# Altium footprint library Semicon-Discrete.pcblib: 205 footprints (part 1 of 13)
Each footprint in its own frame and in the unit in brackets; x right, y up, seen from the top. Pads: shape width x height; smd on the part's side, far side on the other; paste and mask are expansions set on the pad; w line width, h text height; cw(c..) or ccw(c..) is an arc to the next point about the centre after c.
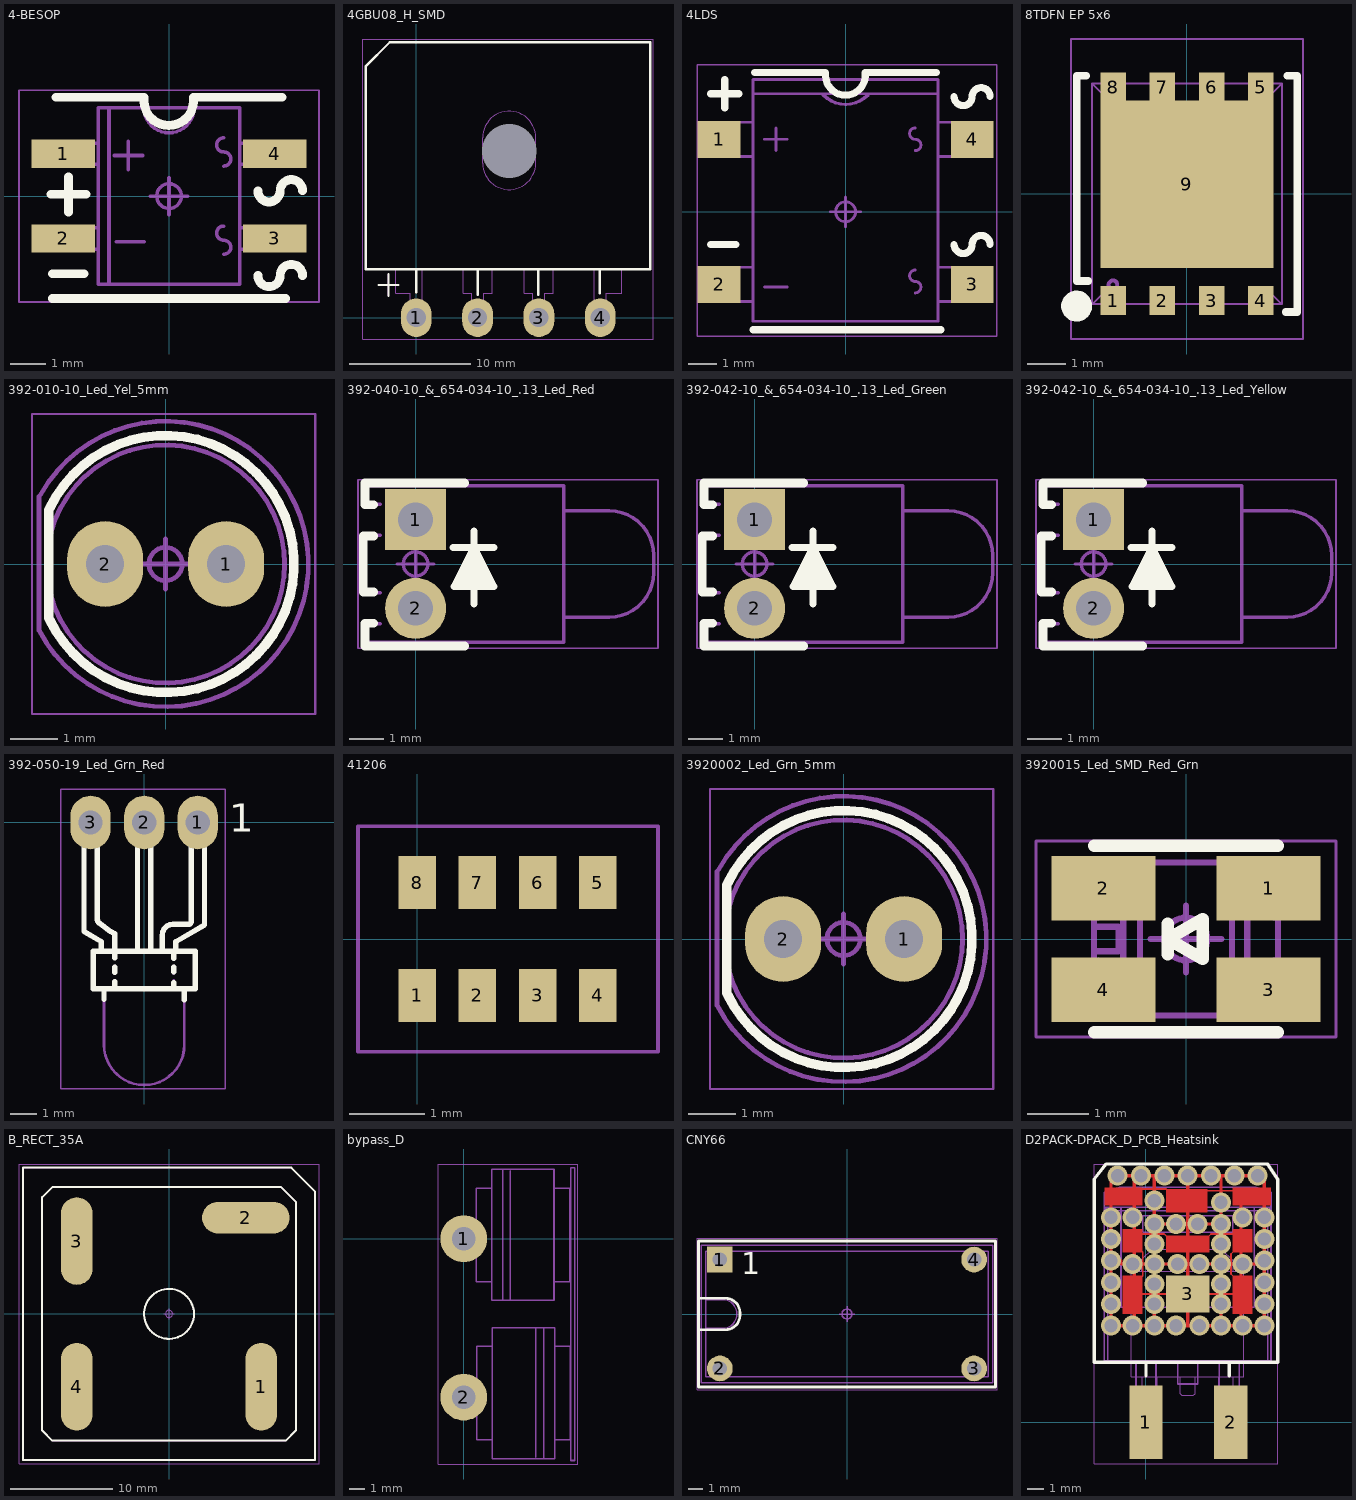
[diagram p0: the footprints below, top view; thin cyan lines are the x and y axes]

## 4-BESOP [mm] "Single Phase Schottly Bridge"
height 3
pads (4):
  rect 1.8x0.8 smd: 1(-3,1.2) 2(-3,-1.2) 3(3,-1.2) 4(3,1.2)
TopOverlay:
  lines w0.25: -3.35,0.05 -2.35,0.05 ; -3.3,-2.9 3.3,-2.9 ; -3.3,-2.2 -2.4,-2.2 ; -3.2,2.8 -0.7,2.8 ccw(c-0.007,2.701) 0.686,2.8 ; -2.85,-0.45 -2.85,0.55 ; 0.7,2.8 3.2,2.8 ; 2.518,-2.25 ccw(c2.834,-2.25) 3.15,-2.25 cw(c3.466,-2.25) 3.782,-2.25 ; 2.518,0.15 ccw(c2.834,0.15) 3.15,0.15 cw(c3.466,0.15) 3.782,0.15
2-TopCompOutl:
  lines w0.1: -2,-1.5 -3.5,-1.5 -3.5,-0.9 -2,-0.9 ; -2,0.9 -3.5,0.9 -3.5,1.5 -2,1.5 ; -1.7,-2.5 -1.7,0 -1.7,2.5 ; -0.707,2.5 ccw(c0,2.5) 0,1.793 ccw(c0,2.5) 0.707,2.5 ; 2,-1.5 3.5,-1.5 3.5,-0.9 2,-0.9 ; 2,0.9 3.5,0.9 3.5,1.5 2,1.5 ; -2,-2.5 0,-2.5 2,-2.5 2,0 2,2.5 0,2.5 -2,2.5 -2,0 -2,-2.5
4-TopCourty:
  circle w0.1: c0,0 r0.35
  lines w0.05: -4.25,-3 4.25,-3 4.25,3 -4.25,3 -4.25,-3
  lines w0.1: -0.525,0 0.525,0 ; 0,-0.525 0,0.525
7-TopAssy:
  lines w0.1: -2,-1.5 -3.5,-1.5 -3.5,-0.9 -2,-0.9 ; -2,0.9 -3.5,0.9 -3.5,1.5 -2,1.5 ; -1.7,-2.5 -1.7,0 -1.7,2.5 ; -1.55,1.15 -0.75,1.15 ; -1.5,-1.3 -0.7,-1.3 ; -1.15,0.75 -1.15,1.55 ; -0.707,2.5 ccw(c0,2.5) 0,1.793 ccw(c0,2.5) 0.707,2.5 ; 1.55,-1.65 ccw(c1.55,-1.45) 1.55,-1.25 cw(c1.55,-1.05) 1.55,-0.85 ; 1.55,0.85 ccw(c1.55,1.05) 1.55,1.25 cw(c1.55,1.45) 1.55,1.65 ; 2,-1.5 3.5,-1.5 3.5,-0.9 2,-0.9 ; 2,0.9 3.5,0.9 3.5,1.5 2,1.5 ; -2,-2.5 -2,0 -2,2.5 0,2.5 2,2.5 2,0 2,-2.5 0,-2.5 -2,-2.5
  text ".Designator" at 0.9,-2.1 h2.2

## 4GBU08_H_SMD [mm]
height 4
pads (5):
  round 0 hole 4.5 unplated: 0(7.7,13.8)
  oval 2.55x3.2 hole 1.6: 1(0,0) 2(5.08,0) 3(10.16,0) 4(15.24,0)
TopOverlay:
  lines w0.2: -3.1,2.7 -1.5,2.7 ; -2.3,1.8 -2.3,3.6 ; 0,2.1 0,4 ; 5.1,1.9 5.1,4 ; 10.1,1.9 10.1,4 ; 15.2,2 15.2,4 ; -4.2,4 -4.2,20.8 -2.2,22.8 19.4,22.8 19.4,4 -4.2,4
2-TopCompOutl:
  lines w0.05: -1.7,4 -1.7,2 -0.5,2 -0.5,0 0,0 0.5,0 0.5,2 0.5,4 ; 3.9,4 3.9,2 4.6,2 4.6,0 5.1,0 5.6,0 5.6,2 6.3,2 6.3,4 ; 8.96,4 8.96,2 9.66,2 9.66,0 10.16,0 10.66,0 10.66,2 11.36,2 11.36,4 ; 14.74,4 14.74,2 14.74,0 15.24,0 15.74,0 15.74,2 17.04,2 17.04,4 ; -4.2,4 -4.2,20.8 -2.2,22.8 19.4,22.8 19.4,4 -4.2,4 ; 5.5,12.8 ccw(c7.7,12.8) 9.9,12.8 9.9,14.9 ccw(c7.7,14.9) 5.5,14.9 5.5,12.8
4-TopCourty:
  circle w0.1: c0,0 r0.329
  lines w0.05: -4.425,-1.775 19.625,-1.775 19.625,23.075 -4.425,23.075 -4.425,-1.775
  lines w0.1: -0.525,0 0.525,0 ; 0,-0.525 0,0.525
7-TopAssy:
  lines w0.1: -3.1,2.7 -1.5,2.7 ; -2.3,1.8 -2.3,3.6 ; 0,2.1 0,4 ; 5.1,1.9 5.1,4 ; 10.1,1.9 10.1,4 ; 15.2,2 15.2,4 ; -4.2,4 19.4,4 19.4,22.8 -2.2,22.8 -4.2,20.8 -4.2,4
  text ".Designator" at 4.025,8.125 h2.2

## 4LDS [mm]
height 2.6
pads (4):
  rect 1.5x1.3 smd: 1(-4.45,2.55) 2(-4.45,-2.55) 3(4.45,-2.55) 4(4.45,2.55)
TopOverlay:
  lines w0.25: -4.75,-1.15 -3.85,-1.15 ; -4.75,4.15 -3.75,4.15 ; -4.25,3.65 -4.25,4.65 ; -3.25,-4.15 3.35,-4.15 ; -3.2,4.9 -0.7,4.9 ccw(c-0.007,4.801) 0.686,4.9 ; 0.7,4.9 3.2,4.9 ; 3.818,-1.15 ccw(c4.134,-1.15) 4.45,-1.15 cw(c4.766,-1.15) 5.082,-1.15 ; 3.818,4.05 ccw(c4.134,4.05) 4.45,4.05 cw(c4.766,4.05) 5.082,4.05
2-TopCompOutl:
  lines w0.1: -4.35,-3.15 -4.35,-1.95 ; -4.35,1.95 -4.35,3.15 ; -3.25,-3.15 -4.95,-3.15 -4.95,-1.95 -3.25,-1.95 ; -3.25,1.95 -4.95,1.95 -4.95,3.15 -3.25,3.15 ; -3.25,4.15 3.25,4.15 ; -0.756,4.1 ccw(c0.022,4.878) 0.8,4.1 ; 3.25,-3.15 5.05,-3.15 5.05,-1.95 3.25,-1.95 ; 3.25,1.95 5.05,1.95 5.05,3.15 3.25,3.15 ; 4.35,-3.15 4.35,-1.95 ; 4.35,1.95 4.35,3.15 ; -3.25,-3.85 3.25,-3.85 3.25,4.65 -3.25,4.65 -3.25,-3.85
4-TopCourty:
  circle w0.1: c0,0 r0.35
  lines w0.05: -5.225,-4.375 -5.225,5.175 5.325,5.175 5.325,-4.375 -5.225,-4.375
  lines w0.1: -0.525,0 0.525,0 ; 0,-0.525 0,0.525
7-TopAssy:
  lines w0.1: -4.35,-3.15 -4.35,-1.95 ; -4.35,1.95 -4.35,3.15 ; -3.25,-3.15 -4.95,-3.15 -4.95,-1.95 -3.25,-1.95 ; -3.25,1.95 -4.95,1.95 -4.95,3.15 -3.25,3.15 ; -3.25,4.15 3.25,4.15 ; -2.85,-2.65 -2.05,-2.65 ; -2.85,2.55 -2.05,2.55 ; -2.45,2.15 -2.45,2.95 ; -0.8,4.1 ccw(c-0.022,4.878) 0.756,4.1 ; 2.45,-2.85 ccw(c2.45,-2.65) 2.45,-2.45 cw(c2.45,-2.25) 2.45,-2.05 ; 2.45,2.15 ccw(c2.45,2.35) 2.45,2.55 cw(c2.45,2.75) 2.45,2.95 ; 3.25,-3.15 5.05,-3.15 5.05,-1.95 3.25,-1.95 ; 3.25,1.95 5.05,1.95 5.05,3.15 3.25,3.15 ; 4.35,-3.15 4.35,-1.95 ; 4.35,1.95 4.35,3.15 ; -3.25,-3.85 -3.25,4.65 3.25,4.65 3.25,-3.85 -3.25,-3.85
  text ".Designator" at -2.4,-0.5 h2.2
3D body "4LDS.STEP": height 2.7, standoff 0, extent -5.15,-4.25 5.15,4.25

## 8TDFN EP 5x6 [mm] "8 - Power TDFN Exposed Pad 5 x 6mm"
height 1.1
pads (9):
  rect 0.66x0.75 smd: 1(-1.905,-2.76) 2(-0.635,-2.76) 3(0.635,-2.76) 4(1.905,-2.76) 5(1.905,2.76) 6(0.635,2.76) 7(-0.635,2.76) 8(-1.905,2.76)
  rect 4.46x4.33 smd: 9(0,0.25)
TopOverlay:
  circle w0.4: c-2.85,-2.9 r0.2
  lines w0.2: -2.6,3.05 -2.85,3.05 -2.85,-2.25 -2.55,-2.25 ; 2.55,-3.05 2.85,-3.05 2.85,3.05 2.6,3.05
2-TopCompOutl:
  circle w0.1: c-1.912,-2.35 r0.112
  lines w0.05: -2.1,-2.5 -2.45,-2.85 ; -2.1,2.5 -2.45,2.85 ; -2.05,-2.85 -2.05,-3 -1.8,-3 -1.8,-2.85 ; -2.05,2.85 -2.05,3 -1.8,3 -1.8,2.85 ; -0.75,-2.85 -0.75,-3 -0.5,-3 -0.5,-2.85 ; -0.75,2.85 -0.75,3 -0.5,3 -0.5,2.85 ; 0.5,-2.85 0.5,-3 0.75,-3 0.75,-2.85 ; 0.5,2.85 0.5,3 0.75,3 0.75,2.85 ; 1.8,-2.85 1.8,-3 2.05,-3 2.05,-2.85 ; 1.8,2.85 1.8,3 2.05,3 2.05,2.85 ; 2.1,-2.5 2.45,-2.85 ; 2.1,2.5 2.45,2.85 ; -2.45,-2.85 -2.45,0 -2.45,2.85 ; -2.45,-2.85 0,-2.85 2.45,-2.85 ; -2.45,2.85 0,2.85 2.45,2.85 ; 2.45,-2.85 2.45,0 2.45,2.85
4-TopCourty:
  circle w0.1: c0,0 r0.35
  lines w0.05: -3,-3.75 3,-3.75 3,4 -3,4 -3,-3.75
  lines w0.1: -0.525,0 0.525,0 ; 0,-0.525 0,0.525
7-TopAssy:
  circle w0.1: c-1.912,-2.35 r0.112
  lines w0.05: -2.1,-2.5 -2.45,-2.85 ; -2.1,2.5 -2.45,2.85 ; -2.05,-2.85 -2.05,-3 -1.8,-3 -1.8,-2.85 ; -2.05,2.85 -2.05,3 -1.8,3 -1.8,2.85 ; -0.75,-2.85 -0.75,-3 -0.5,-3 -0.5,-2.85 ; -0.75,2.85 -0.75,3 -0.5,3 -0.5,2.85 ; 0.5,-2.85 0.5,-3 0.75,-3 0.75,-2.85 ; 0.5,2.85 0.5,3 0.75,3 0.75,2.85 ; 1.8,-2.85 1.8,-3 2.05,-3 2.05,-2.85 ; 1.8,2.85 1.8,3 2.05,3 2.05,2.85 ; 2.1,-2.5 2.45,-2.85 ; 2.1,2.5 2.45,2.85 ; -2.45,-2.85 0,-2.85 2.45,-2.85 ; -2.45,-2.85 -2.45,0 -2.45,2.85 ; -2.45,2.85 0,2.85 2.45,2.85 ; 2.45,-2.85 2.45,0 2.45,2.85
  text ".Designator" at -2.1,-0.6 h2.2
3D body "8TDFN EP 5x6.STEP": height 1, standoff 0, extent -2.45,-3 2.45,3

## 392-010-10_Led_Yel_5mm [mm] "LED,T1-3/4 (5mm),Yel,Extra Bright"
height 8.6
pads (2):
  oval 1.6x1.8 hole 0.8: 1(1.27,0) 2(-1.27,0)
TopOverlay:
  lines w0.2: -2.451,-1.14 -2.451,1.14 ; -2.431,-1.174 ccw(c0,0) -2.431,1.174
  text ".Designator" at -3,3.5 h2.2
2-TopCompOutl:
  circle w0.1: c0,0 r2.5
  lines w0.1: -2.655,-1.4 -2.655,1.425 ; -2.649,-1.408 ccw(c0,0) -2.624,1.454
4-TopCourty:
  circle w0.1: c0,0 r0.35
  lines w0.05: -2.805,-3.15 3.145,-3.15 3.145,3.15 -2.805,3.15 -2.805,-3.15
  lines w0.1: -0.54,0 0.51,0 ; 0,-0.525 0,0.525
7-TopAssy:
  circle w0.1: c0,0 r2.5
  lines w0.1: -2.655,-1.4 -2.655,1.425 ; -2.649,-1.408 ccw(c0,0) -2.624,1.454
  text ".Designator" at -1.75,-0.5 h2.2
3D body "392-010-10_Led_Yel_5mm .STEP": height 8.89, standoff -10.16, extent -2.605,-2.8 2.805,2.788

## 392-040-10_&_654-034-10_.13_Led_Red [mm] "LED,T1 (3mm),Red,High Efficiency With RA Socket"
height 5
pads (2):
  rect 1.75x1.75 / inner round 1.524 / far side round 1.524 hole 1: 1(0,1.27)
  round 1.75 / inner round 1.524 / far side round 1.524 hole 1: 2(0,-1.27)
TopOverlay:
  region: 1.65,0.475 1.1,-0.65 2.25,-0.65
  lines w0.2: 1.075,0.475 2.25,0.475 ; 1.675,-1.15 1.675,-0.65 ; 1.675,0.95 1.675,0.475 ; 1.675,0.475 2.25,-0.65 1.1,-0.65 1.675,0.475
  lines w0.254: -1.2,-1.7 -1.45,-1.7 -1.45,-2.35 1.4,-2.35 ; -1.2,-0.8 -1.5,-0.8 -1.5,0.8 -1.2,0.8 ; -1.2,1.7 -1.45,1.7 -1.45,2.325 1.4,2.325
4-TopCourty:
  circle w0.1: c0,0 r0.35
  lines w0.05: -1.651,-2.413 6.95,-2.413 6.95,2.413 -1.651,2.413 -1.651,-2.413
  lines w0.1: -0.525,0 0.525,0 ; 0,-0.525 0,0.525
7-TopAssy:
  region: 1.65,0.475 1.1,-0.65 2.25,-0.65
  lines w0.1: -1.016,-1.714 -1.446,-1.714 -1.446,-2.25 1.48,-2.25 4.25,-2.25 ; -1.016,-0.826 -1.446,-0.826 -1.446,0.826 -1.016,0.826 ; -1.016,1.714 -1.446,1.714 -1.446,2.25 4.25,2.25 ; 1.075,0.475 2.25,0.475 ; 1.675,-1.15 1.675,-0.65 ; 1.675,0.95 1.675,0.475 ; 4.254,-2.25 4.254,2.25 ; 4.254,-1.524 5.556,-1.524 ccw(c5.556,-0.254) 6.826,-0.254 6.826,0.254 ccw(c5.556,0.254) 5.556,1.524 4.254,1.524 ; 1.675,0.475 1.1,-0.65 2.25,-0.65 1.675,0.475
  text ".Designator" at 2.65,-0.725 h1.8

## 392-042-10_&_654-034-10_.13_Led_Green [mm] "LED,T1 (3mm),Green,High Efficiency With RA Socket"
height 5
pads (2):
  rect 1.75x1.75 / inner round 1.524 / far side round 1.524 hole 1: 1(0,1.27)
  round 1.75 / inner round 1.524 / far side round 1.524 hole 1: 2(0,-1.27)
TopOverlay:
  region: 1.65,0.475 1.1,-0.65 2.25,-0.65
  lines w0.2: 1.075,0.475 2.25,0.475 ; 1.675,-1.15 1.675,-0.65 ; 1.675,0.95 1.675,0.475 ; 1.675,0.475 2.25,-0.65 1.1,-0.65 1.675,0.475
  lines w0.254: -1.2,-1.7 -1.45,-1.7 -1.45,-2.35 1.4,-2.35 ; -1.2,-0.8 -1.5,-0.8 -1.5,0.8 -1.2,0.8 ; -1.2,1.7 -1.45,1.7 -1.45,2.325 1.4,2.325
4-TopCourty:
  circle w0.1: c0,0 r0.35
  lines w0.05: -1.651,-2.413 6.95,-2.413 6.95,2.413 -1.651,2.413 -1.651,-2.413
  lines w0.1: -0.525,0 0.525,0 ; 0,-0.525 0,0.525
7-TopAssy:
  region: 1.65,0.475 1.1,-0.65 2.25,-0.65
  lines w0.1: -1.016,-1.714 -1.446,-1.714 -1.446,-2.25 1.48,-2.25 4.25,-2.25 ; -1.016,-0.826 -1.446,-0.826 -1.446,0.826 -1.016,0.826 ; -1.016,1.714 -1.446,1.714 -1.446,2.25 4.25,2.25 ; 1.075,0.475 2.25,0.475 ; 1.675,-1.15 1.675,-0.65 ; 1.675,0.95 1.675,0.475 ; 4.254,-2.25 4.254,2.25 ; 4.254,-1.524 5.556,-1.524 ccw(c5.556,-0.254) 6.826,-0.254 6.826,0.254 ccw(c5.556,0.254) 5.556,1.524 4.254,1.524 ; 1.675,0.475 1.1,-0.65 2.25,-0.65 1.675,0.475
  text ".Designator" at 2.65,-0.725 h1.8

## 392-042-10_&_654-034-10_.13_Led_Yellow [mm] "LED,T1 (3mm),Yellow,High Efficiency With RA Socket"
height 5
pads (2):
  rect 1.75x1.75 / inner round 1.524 / far side round 1.524 hole 1: 1(0,1.27)
  round 1.75 / inner round 1.524 / far side round 1.524 hole 1: 2(0,-1.27)
TopOverlay:
  region: 1.65,0.475 1.1,-0.65 2.25,-0.65
  lines w0.2: 1.075,0.475 2.25,0.475 ; 1.675,-1.15 1.675,-0.65 ; 1.675,0.95 1.675,0.475 ; 1.675,0.475 2.25,-0.65 1.1,-0.65 1.675,0.475
  lines w0.254: -1.2,-1.7 -1.45,-1.7 -1.45,-2.35 1.4,-2.35 ; -1.2,-0.8 -1.5,-0.8 -1.5,0.8 -1.2,0.8 ; -1.2,1.7 -1.45,1.7 -1.45,2.325 1.4,2.325
4-TopCourty:
  circle w0.1: c0,0 r0.35
  lines w0.05: -1.651,-2.413 6.95,-2.413 6.95,2.413 -1.651,2.413 -1.651,-2.413
  lines w0.1: -0.525,0 0.525,0 ; 0,-0.525 0,0.525
7-TopAssy:
  region: 1.65,0.475 1.1,-0.65 2.25,-0.65
  lines w0.1: -1.016,-1.714 -1.446,-1.714 -1.446,-2.25 1.48,-2.25 4.25,-2.25 ; -1.016,-0.826 -1.446,-0.826 -1.446,0.826 -1.016,0.826 ; -1.016,1.714 -1.446,1.714 -1.446,2.25 4.25,2.25 ; 1.075,0.475 2.25,0.475 ; 1.675,-1.15 1.675,-0.65 ; 1.675,0.95 1.675,0.475 ; 4.254,-2.25 4.254,2.25 ; 4.254,-1.524 5.556,-1.524 ccw(c5.556,-0.254) 6.826,-0.254 6.826,0.254 ccw(c5.556,0.254) 5.556,1.524 4.254,1.524 ; 1.675,0.475 1.1,-0.65 2.25,-0.65 1.675,0.475
  text ".Designator" at 2.65,-0.725 h1.8

## 392-050-19_Led_Grn_Red [mm]
height 3
pads (3):
  oval 1.5x2 hole 0.9: 1(2,0) 2(0,0) 3(-2,0)
TopOverlay:
  lines w0.2: -1.599,-4.802 -1.599,-4.448 -2.25,-4.072 -2.25,-0.55 -2.25,0.25 -2,0.25 -1.75,0.25 -1.75,-0.55 -1.75,-3.602 ccw(c-1.55,-3.602) -1.645,-3.779 -1.25,-4.072 -1.099,-4.16 -1.099,-4.802 ; -1.5,-6.6 -1.5,-6.202 ; -1.1,-6.195 -1.1,-5.95 ; -1.1,-5.6 -1.1,-5.4 ; -1.1,-5.05 -1.1,-4.802 ; -0.25,-4.802 -0.25,-0.55 -0.25,0.25 0,0.25 0.25,0.25 0.25,-0.55 0.25,-4.802 ; 0.677,-4.802 0.677,-4.448 0.677,-4.202 cw(c1.077,-4.202) 1.077,-3.802 1.65,-3.802 ccw(c1.65,-3.702) 1.75,-3.702 1.75,-0.55 1.75,0.25 2,0.25 2.25,0.25 2.25,-0.55 2.25,-3.829 1.177,-4.448 1.177,-4.802 ; 1.1,-6.175 1.1,-5.975 ; 1.1,-5.575 1.1,-5.4 ; 1.1,-5.075 1.1,-4.802 ; 1.5,-6.625 1.5,-6.202 ; -1.9,-6.202 1.9,-6.202 1.9,-4.802 -1.9,-4.802 -1.9,-6.202
  text "1" at 3.175,-0.7 h1.8
2-TopCompOutl:
  lines w0.1: -1.599,-4.802 -1.599,-4.448 -2.25,-4.072 -2.25,-0.55 -2.25,0.25 -2,0.25 -1.75,0.25 -1.75,-0.55 -1.75,-3.602 ccw(c-1.55,-3.602) -1.645,-3.779 -1.25,-4.072 -1.099,-4.16 -1.099,-4.802 -1.1,-5.075 ; -1.5,-6.202 -1.5,-8.302 ccw(c0,-8.302) 0,-9.802 ccw(c0,-8.302) 1.5,-8.302 1.5,-6.202 ; -1.1,-5.65 -1.1,-5.35 ; -1.099,-6.195 -1.099,-5.909 ; -0.25,-4.802 -0.25,-0.55 -0.25,0.25 0,0.25 0.25,0.25 0.25,-0.55 0.25,-4.802 ; 0.677,-4.802 0.677,-4.448 0.677,-4.202 cw(c1.077,-4.202) 1.077,-3.802 1.65,-3.802 ccw(c1.65,-3.702) 1.75,-3.702 1.75,-0.55 1.75,0.25 2,0.25 2.25,0.25 2.25,-0.55 2.25,-3.829 1.177,-4.448 1.177,-4.802 ; 1.099,-6.195 1.099,-5.9 ; 1.099,-4.802 1.1,-5.075 ; 1.1,-5.65 1.1,-5.35 ; -1.9,-6.202 -1.9,-4.802 1.9,-4.802 1.9,-6.202 -1.9,-6.202
4-TopCourty:
  circle w0.1: c0,0 r0.35
  lines w0.05: -3.125,-9.95 -3.125,1.25 3.025,1.25 3.025,-9.95 -3.125,-9.95
  lines w0.1: -0.525,0 0.525,0
7-TopAssy:
  lines w0.1: -1.599,-4.802 -1.599,-4.448 -2.25,-4.072 -2.25,-0.55 -2.25,0.25 -2,0.25 -1.75,0.25 -1.75,-0.55 -1.75,-3.602 ccw(c-1.55,-3.602) -1.645,-3.779 -1.25,-4.072 -1.099,-4.16 -1.099,-4.802 -1.1,-5.075 ; -1.5,-6.202 -1.5,-8.302 ccw(c0,-8.302) 0,-9.802 ccw(c0,-8.302) 1.5,-8.302 1.5,-6.202 ; -1.1,-5.65 -1.1,-5.35 ; -1.099,-6.195 -1.099,-5.909 ; -0.25,-4.802 -0.25,-0.55 -0.25,0.25 0,0.25 0.25,0.25 0.25,-0.55 0.25,-4.802 ; 0.677,-4.802 0.677,-4.448 0.677,-4.202 cw(c1.077,-4.202) 1.077,-3.802 1.65,-3.802 ccw(c1.65,-3.702) 1.75,-3.702 1.75,-0.55 1.75,0.25 2,0.25 2.25,0.25 2.25,-0.55 2.25,-3.829 1.177,-4.448 1.177,-4.802 ; 1.099,-6.195 1.099,-5.9 ; 1.099,-4.802 1.1,-5.075 ; 1.1,-5.65 1.1,-5.35 ; -1.9,-6.202 -1.9,-4.802 1.9,-4.802 1.9,-6.202 -1.9,-6.202
  text "1" at 3.175,-0.7 h1.8
  text ".Designator" at -1.025,-8.075 h2.2
3D body "392-050-19_Led_Grn_Red.STEP": height 2.15, standoff -1.8, extent -2.25,-9.8 2.25,0.252

## 41206 [mm] "41206"
pads (8):
  rect 0.5x0.7 smd: 1(0,-0.75) 2(0.8,-0.75) 3(1.6,-0.75) 4(2.4,-0.75) 5(2.4,0.75) 6(1.6,0.75) 7(0.8,0.75) 8(0,0.75)
4-TopCourty:
  lines w0.05: -0.787,-1.499 -0.787,1.499 3.2,1.499 3.2,-1.499 -0.787,-1.499
7-TopAssy:
  text ".Designator" at -2.54,-0.381 h1.8

## 3920002_Led_Grn_5mm [mm] "LED,T1-3/4 (5mm),Grn,Extra Bright"
height 8.6
pads (2):
  oval 1.6x1.8 hole 0.8: 1(1.27,0) 2(-1.27,0)
TopOverlay:
  lines w0.2: -2.451,-1.14 -2.451,1.14 ; -2.431,-1.174 ccw(c0,0) -2.431,1.174
  text ".Designator" at -2.8,3.3 h2.2
2-TopCompOutl:
  circle w0.1: c0,0 r2.5
  lines w0.1: -2.655,-1.4 -2.655,1.425 ; -2.649,-1.408 ccw(c0,0) -2.624,1.454
4-TopCourty:
  circle w0.1: c0,0 r0.35
  lines w0.05: -2.805,-3.15 -2.805,3.15 3.145,3.15 3.145,-3.15 -2.805,-3.15
  lines w0.1: -0.535,0 0.515,0 ; 0,-0.525 0,0.525
7-TopAssy:
  circle w0.1: c0,0 r2.5
  lines w0.1: -2.655,-1.4 -2.655,1.425 ; -2.649,-1.408 ccw(c0,0) -2.624,1.454
  text ".Designator" at -1.8,-0.6 h2.2
3D body "3920002_Led_Grn_5mm .STEP": height 8.89, standoff -10.16, extent -2.605,-2.8 2.805,2.788

## 3920015_Led_SMD_Red_Grn [mm] "LED,SMD,Red/Grn 1.7V R,2.1V G,3x2.5mm"
height 0.5
pads (4):
  rect 1.7x1.05 smd: 1(1.35,0.83) 2(-1.35,0.83) 3(1.35,-0.83) 4(-1.35,-0.83)
TopOverlay:
  lines w0.2: -1.5,-1.525 1.5,-1.525 ; -1.5,1.525 1.5,1.525 ; -0.3,-0.25 -0.3,0.25 ; -0.3,0 0.275,-0.325 0.275,0.325 -0.3,0
2-TopCompOutl:
  lines w0.1: -1.5,-1 -1.5,-1.15 ; -1.5,-1 ccw(c-1.5,-0.75) -1.5,-0.5 -1.5,-0.35 ; -1.025,-1.25 -1.025,1.25 -0.75,1.25 ; -1,1.25 -1.5,1.25 -1.5,1.15 ; 1.5,-1 1.5,-1.15 ; 1.5,-1 cw(c1.5,-0.75) 1.5,-0.5 1.5,-0.35 ; -1.5,-1.15 ccw(c-1.5,-0.75) -1.5,-0.35 ; -1.5,-1.15 -1.5,-1.25 -1,-1.25 -0.75,-1.25 ; -1.5,-0.35 -1.5,-0.2 ; -1.5,-0.2 -1.1,-0.2 -1.1,0.2 -1.5,0.2 ; -1.5,-0.2 -1.5,0.2 ; -1.5,0.2 -1.5,0.35 ; -1.5,0.35 ccw(c-1.5,0.75) -1.5,1.15 ; -1.5,0.35 -1.5,0.5 ccw(c-1.5,0.75) -1.5,1 -1.5,1.15 ; -0.75,-1.25 0.75,-1.25 ; -0.75,-1.25 -0.75,1.25 ; -0.75,1.25 0.75,1.25 ; 0.75,-1.25 0.75,1.25 ; 0.75,-1.25 1,-1.25 ; 0.75,1.25 1,1.25 ; 1,-1.25 1,1.25 ; 1,-1.25 1.5,-1.25 1.5,-1.15 ; 1,1.25 1.5,1.25 1.5,1.15 ; 1.5,-1.15 cw(c1.5,-0.75) 1.5,-0.35 ; 1.5,-0.35 1.5,0.35 ; 1.5,0.35 cw(c1.5,0.75) 1.5,1.15 ; 1.5,0.35 1.5,0.5 cw(c1.5,0.75) 1.5,1 1.5,1.15
4-TopCourty:
  circle w0.1: c0,0 r0.35
  lines w0.05: -2.45,-1.6 2.45,-1.6 2.45,1.6 -2.45,1.6 -2.45,-1.6
  lines w0.1: -0.575,0 0.575,0 ; 0,-0.55 0,0.55
7-TopAssy:
  lines w0.1: -1.5,-1.25 1.5,-1.25 1.5,1.25 -1.5,1.25 -1.5,-1.25
  text ".Designator" at -0.75,-0.425 h1.6
3D body "3920015_Led_SMD_Red_Grn.STEP": height 0.85, standoff -0.25, extent -1.5,-1.25 1.5,1.25

## B_RECT_35A [mm]
pads (4):
  oval 3.1x8.6 all layers, no hole: 1(9.05,-7.15) 3(-9.05,7.15) 4(-9.05,-7.15)
  oval 8.6x3.1 all layers, no hole: 2(7.55,9.45)
TopOverlay:
  circle w0.2: c0,0 r2.452
  lines w0.2: -14.35,-14.35 0,-14.35 14.35,-14.35 14.35,12 12,14.35 -14.35,14.35 -14.35,-14.35 ; -12.45,-11.45 -11.45,-12.45 0,-12.45 11.45,-12.45 12.45,-11.45 12.45,11 11,12.45 -11.45,12.45 -12.45,11.45 -12.45,-11.45
2-TopCompOutl:
  text "top view" at -4.8,3.7 h2
3-RoutPlating:
  lines w1.1: -9.05,-9.9 -9.05,-4.4 ; -9.05,4.4 -9.05,9.9 ; 4.8,9.45 10.3,9.45 ; 9.05,-9.9 9.05,-4.4
4-TopCourty:
  circle w0.1: c0,0 r0.35
  lines w0.05: -14.725,-14.725 14.725,-14.725 14.725,14.7 -14.725,14.7 -14.725,-14.725
  lines w0.1: -0.525,0 0.525,0 ; 0,-0.525 0,0.525
7-TopAssy:
  circle w0.1: c0,0 r2.452
  lines w0.1: -14.35,-14.35 -14.35,14.35 12,14.35 14.35,12 14.35,-14.35 0,-14.35 -14.35,-14.35 ; -12.45,-11.45 -12.45,11.45 -11.45,12.45 11,12.45 12.45,11 12.45,-11.45 11.45,-12.45 0,-12.45 -11.45,-12.45 -12.45,-11.45
  text ".Designator" at -4.4,-5.175 h2.2

## bypass_D [mm]
pads (2):
  round 3 hole 1.5: 1(0,0) 2(0,-10.16)
2-TopCompOutl:
  lines w0.1: 1.79,-2.746 0.79,-2.746 0.79,3.254 1.79,3.254 ; 1.83,-12.906 0.83,-12.906 0.83,-6.906 1.83,-6.906 ; 2.49,-3.946 2.49,4.454 ; 2.99,-3.946 2.99,4.354 ; 4.63,-14.006 4.63,-5.706 ; 5.13,-14.106 5.13,-5.706 ; 5.79,-2.746 6.79,-2.746 6.79,3.254 5.79,3.254 ; 5.83,-12.906 6.83,-12.906 6.83,-6.906 5.83,-6.906 ; 1.79,-3.946 5.79,-3.946 5.79,4.454 1.79,4.454 1.79,-3.946 ; 1.83,-14.106 1.83,-5.706 5.83,-5.706 5.83,-14.106 1.83,-14.106 ; 6.858,-14.224 6.858,-8.354 6.858,4.572 7.112,4.572 7.112,-14.224 6.858,-14.224
4-TopCourty:
  circle w0.1: c0,0 r0.35
  lines w0.05: -1.65,-14.45 7.325,-14.45 7.325,4.8 -1.65,4.8 -1.65,-14.45
  lines w0.1: -0.525,0 0.525,0 ; 0,-0.525 0,0.525
7-TopAssy:
  text ".Designator" at 0.45,-5.45 h2.2

## CNY66 [mm] "High Voltage Optocoupler"
height 6.1
pads (4):
  rect 1.8x1.8 hole 1: 1(-8.9,3.81)
  round 1.8 hole 1: 2(-8.9,-3.81) 3(8.9,-3.81) 4(8.9,3.81)
TopOverlay:
  lines w0.2: -10.4,-1.1 -8.5,-1.1 ccw(c-8.5,-0.1) -7.5,-0.1 -7.5,0 -7.5,0.1 ccw(c-8.5,0.1) -8.5,1.1 -10.4,1.1 ; -10.4,-5.1 -10.4,0 -10.4,5.1 0,5.1 10.4,5.1 10.4,0 10.4,-5.1 0,-5.1 -10.4,-5.1
  text "1" at -7.4,2.8 h1.52
2-TopCompOutl:
  lines w0.1: -9.9,-1 -8.8,-1 -8.7,-1 ccw(c-8.7,0) -7.7,0 ccw(c-8.7,0) -8.7,1 -8.8,1 -9.9,1 ; -10.2,-4.8 -10.2,0 -10.2,4.8 0,4.8 10.2,4.8 10.2,0 10.2,-4.8 0,-4.8 -10.2,-4.8 ; -9.9,-4.4 0,-4.4 9.9,-4.4 9.9,0 9.9,4.4 0,4.4 -9.9,4.4 -9.9,0 -9.9,-4.4
  text "CNY66" at -3.025,1.7 h3
4-TopCourty:
  circle w0.1: c0,0 r0.35
  lines w0.05: -10.5,-5.3 -10.5,0 -10.5,5.3 0,5.3 10.5,5.3 10.5,0 10.5,-5.3 0,-5.3 -10.5,-5.3
  lines w0.1: -0.525,0 0.525,0 ; 0,-0.55 0,0.55
7-TopAssy:
  lines w0.1: -9.9,-1 -8.8,-1 -8.7,-1 ccw(c-8.7,0) -7.7,0 ccw(c-8.7,0) -8.7,1 -8.8,1 -9.9,1 ; -10.2,-4.8 0,-4.8 10.2,-4.8 10.2,0 10.2,4.8 0,4.8 -10.2,4.8 -10.2,0 -10.2,-4.8 ; -9.9,-4.4 -9.9,0 -9.9,4.4 0,4.4 9.9,4.4 9.9,0 9.9,-4.4 0,-4.4 -9.9,-4.4
  text ".Designator" at -3,-0.3 h1.8
  text "CNY66" at -3.025,1.725 h3
3D body "CNY66.STEP": height 6.1, standoff -3, extent -10.2,-4.8 10.2,4.8

## D2PACK-DPACK_D_PCB_Heatsink [mm]
pads (3):
  rect 2x4.4 smd: 1(0,0) 2(5.08,0)
  rect 2.6x2.2 smd: 3(2.5,7.7)
via 3.2,5.8 diameter 1.2 hole 0.8
via 4.5,5.8 diameter 1.2 hole 0.8
via 5.8,5.8 diameter 1.2 hole 0.8
via 1.8,5.8 diameter 1.2 hole 0.8
via 0.5,5.8 diameter 1.2 hole 0.8
via -0.8,5.8 diameter 1.2 hole 0.8
via -2.1,5.8 diameter 1.2 hole 0.8
via -2.1,7.1 diameter 1.2 hole 0.8
via -2.1,8.4 diameter 1.2 hole 0.8
via -2.1,9.7 diameter 1.2 hole 0.8
via -2.1,11 diameter 1.2 hole 0.8
via -1.7,14.8 diameter 1.2 hole 0.8
via -2.1,12.3 diameter 1.2 hole 0.8
via 7.1,12.3 diameter 1.2 hole 0.8
via 6.7,14.8 diameter 1.2 hole 0.8
via 7.1,11 diameter 1.2 hole 0.8
via 7.1,9.7 diameter 1.2 hole 0.8
via 7.1,8.4 diameter 1.2 hole 0.8
via 7.1,7.1 diameter 1.2 hole 0.8
via 7.1,5.8 diameter 1.2 hole 0.8
via 0.5,11.9 diameter 1.2 hole 0.8
via 0.5,13.3 diameter 1.2 hole 0.8
via 1.1,14.8 diameter 1.2 hole 0.8
via -0.3,14.8 diameter 1.2 hole 0.8
via 1.8,11.9 diameter 1.2 hole 0.8
via 0.5,10.7 diameter 1.2 hole 0.8
via 0.5,9.5 diameter 1.2 hole 0.8
via 0.5,8.3 diameter 1.2 hole 0.8
via 0.5,7.1 diameter 1.2 hole 0.8
via 4.5,11.9 diameter 1.2 hole 0.8
via 3.9,14.8 diameter 1.2 hole 0.8
via 2.5,14.8 diameter 1.2 hole 0.8
via 4.5,13.2 diameter 1.2 hole 0.8
via 3.1,11.9 diameter 1.2 hole 0.8
via 4.5,10.7 diameter 1.2 hole 0.8
via 4.5,9.5 diameter 1.2 hole 0.8
via 4.5,8.3 diameter 1.2 hole 0.8
via 4.5,7.1 diameter 1.2 hole 0.8
via 3.2,9.5 diameter 1.2 hole 0.8
via 1.9,9.5 diameter 1.2 hole 0.8
via -0.8,9.5 diameter 1.2 hole 0.8
via 5.3,14.8 diameter 1.2 hole 0.8
via 5.8,12.3 diameter 1.2 hole 0.8
via 5.8,9.5 diameter 1.2 hole 0.8
via -0.8,12.3 diameter 1.2 hole 0.8
TopLayer:
  region: -0.2,8.8 -1.4,8.8 -1.4,6.5 -0.2,6.5
  rectangle: -2.5,13 -0.2,14.1
  region: -0.2,11.6 -1.4,11.6 -1.4,10.2 -0.2,10.2
  region: 6.4,8.8 5.2,8.8 5.2,6.5 6.4,6.5
  region: 6.4,11.6 5.2,11.6 5.2,10.2 6.4,10.2
  rectangle: 5.2,13 7.5,14.1
  rectangle: 1.2,12.6 3.7,14
  rectangle: 1.2,10.2 3.8,11.2
  lines w0.1: -1.5,13.5 -1,14 1.2,14 1.9,13.3 2.5,13.3 ; -0.8,11.1 -0.8,10.8 ; 2.6,10.7 2.5,10.6 ; 6.4,13.6 6.1,13.9 3.1,13.9 2.5,13.3 ; -0.8,10.8 -0.3,11.3 1.1,11.3 1.7,10.7 3.3,10.7 3.9,11.3 5.5,11.3 5.9,10.9 ; -0.8,10.8 -0.2,10.2 -0.2,8.8 -0.8,8.2 -0.8,7.7 2.5,7.7 ; 2.5,7.7 5.8,7.7 5.8,8.2 5.1,8.9 5.1,10.1 5.9,10.9 ; 2.5,7.7 2.5,10.6 ; 2.5,10.6 2.5,13.3 ; 5.9,10.9 5.9,10.9
  lines w0.2: -2.1,9.7 -1.5,9.7 -1.5,9.5 7.1,9.5 7.1,9.7 ; -0.8,5.8 -0.7,5.8 -0.7,14.8 ; 0.5,5.8 0.5,14.8 ; 0.5,11.9 4.5,11.9 ; 2.4,5.8 2.5,5.8 2.5,14.8 ; 4.5,5.8 4.5,14.8 ; 5.7,13.9 5.7,5.8 5.8,5.8 ; -2.1,5.8 -2.1,14.8 7.1,14.8 7.1,5.8 -2.1,5.8
TopOverlay:
  lines w0.2: 0,2.8 0,3.6 ; 5,2.8 5,3.6 ; -3.1,3.6 -3.1,14.6 -2.4,15.5 7.3,15.5 7.9,14.6 7.9,3.6 -3.1,3.6
TopPaste:
  rectangle: -2.6,12.9 -0.1,14.2
  region: -0.1,8.9 -1.5,8.9 -1.5,6.4 -0.1,6.4
  region: -0.1,11.7 -1.5,11.7 -1.5,10.1 -0.1,10.1
  region: 6.5,8.9 5.1,8.9 5.1,6.4 6.5,6.4
  region: 6.5,11.7 5.1,11.7 5.1,10.1 6.5,10.1
  rectangle: 5.1,12.9 7.6,14.2
  rectangle: 1.1,12.5 3.8,14.1
  rectangle: 1.1,10.1 3.9,11.3
TopSolder:
  rectangle: -1.5,6.4 -0.1,8.9
  rectangle: -2.6,12.9 -0.1,14.2
  rectangle: -1.5,10.1 -0.1,11.7
  rectangle: 5.1,6.4 6.5,8.9
  rectangle: 5.1,10.1 6.5,11.7
  rectangle: 5.1,12.9 7.6,14.2
  rectangle: 1.1,12.5 3.8,14.1
  rectangle: 1.1,10.1 3.9,11.3
2-TopCompOutl:
  lines w0.05: -0.275,9.075 -0.25,9.075 -0.25,9.775 0.375,10.4 4.525,10.4 5.225,9.7 5.225,9.075 ; -0.2,2.75 -0.225,2.75 -0.225,0.425 0.675,0.425 0.675,2.75 4.35,2.75 4.35,0.425 5.225,0.425 5.225,2.75 ; 2.05,2.75 2.05,1.725 2.15,1.625 2.85,1.625 2.95,1.725 2.95,2.75 ; -0.875,2.75 -0.875,9.075 5.85,9.075 5.85,2.75 -0.875,2.75
  lines w0.1: -2.3,3.7 -2.3,12.7 ; -0.6,1.7 0.6,1.7 ; -0.6,3.7 -0.6,1.4 -0.4,1.1 -0.4,-1.2 0,-1.2 0.4,-1.2 0.4,1.1 0.6,1.4 0.6,3.7 ; -0.4,0.9 0.4,0.9 ; 1.9,3.7 1.9,2.3 2.5,2.3 3.1,2.3 3.1,3.7 ; 4.4,1.7 5.6,1.7 ; 4.4,3.7 4.4,1.4 4.6,1.1 4.6,-1.2 5,-1.2 5.4,-1.2 5.4,1.1 5.6,1.4 5.6,3.7 ; 4.6,0.9 5.4,0.9 ; 7.3,3.7 7.3,12.7 ; -2.5,12.9 -2.5,3.7 2.5,3.7 7.5,3.7 7.5,12.9 ; -2.5,12.9 2.5,12.9 7.5,12.9 ; -2.5,12.9 -2.5,13.8 -1.6,14.1 2.5,14.1 6.6,14.1 7.5,13.8 7.5,12.9 ; -2.5,12.9 -2.3,12.7 ; -2.3,12.7 2.5,12.7 7.3,12.7 ; 7.3,12.7 7.5,12.9
4-TopCourty:
  circle w0.1: c0,0 r0.35
  lines w0.05: -3.1,-2.5 -3.1,15.5 7.9,15.5 7.9,-2.5 -3.1,-2.5
  lines w0.1: -0.525,0 0.525,0 ; 0,-0.525 0,0.525
5-MCadOutl:
  lines w0.1: -2.5,12.9 -1.5,12.9 -1.5,6.9 2.5,6.9 6.5,6.9 6.5,12.9 7.5,12.9 7.5,13.8 6.6,14.1 2.5,14.1 -1.6,14.1 -2.5,13.8 -2.5,12.9 ; -0.2,11.4 -0.2,12.4 2.5,12.4 5.2,12.4 5.2,11.4 2.5,11.4 -0.2,11.4
7-TopAssy:
  lines w0.1: -2.3,3.7 -2.3,12.7 ; -0.6,1.7 0.6,1.7 ; -0.6,3.7 -0.6,1.4 -0.4,1.1 -0.4,-1.2 0,-1.2 0.4,-1.2 0.4,1.1 0.6,1.4 0.6,3.7 ; -0.4,0.9 0.4,0.9 ; 1.9,3.7 1.9,2.3 2.5,2.3 3.1,2.3 3.1,3.7 ; 4.4,1.7 5.6,1.7 ; 4.4,3.7 4.4,1.4 4.6,1.1 4.6,-1.2 5,-1.2 5.4,-1.2 5.4,1.1 5.6,1.4 5.6,3.7 ; 4.6,0.9 5.4,0.9 ; 7.3,3.7 7.3,12.7 ; -2.5,12.9 -2.3,12.7 ; -2.5,12.9 -2.5,13.8 -1.6,14.1 2.5,14.1 6.6,14.1 7.5,13.8 7.5,12.9 ; -2.5,12.9 2.5,12.9 7.5,12.9 ; -2.5,12.9 -2.5,3.7 2.5,3.7 7.5,3.7 7.5,12.9 ; -2.3,12.7 2.5,12.7 7.3,12.7 ; 7.3,12.7 7.5,12.9
  text ".Designator" at 0.675,7 h2.2